# Altium schematic symbol library Regulator_Switching.SchLib: 1120 symbols (part 3 of 8) (continued)
## LNK615PG (continued)

## LNK616DG
designator *  value LNK616DG  Reference: U
ki_keywords: Energy-Efficient, Accurate CV/CC Switcher for Adapters and Chargers; ki_description: LinkSwitch-II Family, 6.1W Output Power, SO-8C; ki_fp_filters: PowerIntegrations?SO?8C*; Footprint: Package_SO:PowerIntegrations_SO-8C; Datasheet: http://www.powerint.com/sites/default/files/product-docs/linkswitch-ii_family_datasheet.pdf
pins: 1 FB, 2 BP/M, 4 D, 5 S, 6 S hidden, 7 S hidden, 8 S hidden

## LNK616GG
designator *  value LNK616GG  Reference: U
ki_keywords: Energy-Efficient, Accurate CV/CC Switcher for Adapters and Chargers; ki_description: LinkSwitch-II Family, 6.1W Output Power, SMD-8C; ki_fp_filters: PowerIntegrations?SMD?8C*; Footprint: Package_DIP:PowerIntegrations_SMD-8C; Datasheet: http://www.powerint.com/sites/default/files/product-docs/linkswitch-ii_family_datasheet.pdf
pins: 1 FB, 2 BP/M, 4 D, 5 S, 6 S hidden, 7 S hidden, 8 S hidden

## LNK616PG
designator *  value LNK616PG  Reference: U
ki_keywords: Energy-Efficient, Accurate CV/CC Switcher for Adapters and Chargers; ki_description: LinkSwitch-II Family, 6.1W Output Power, DIP-8C; ki_fp_filters: PowerIntegrations?PDIP?8C*; Footprint: Package_DIP:PowerIntegrations_PDIP-8C; Datasheet: http://www.powerint.com/sites/default/files/product-docs/linkswitch-ii_family_datasheet.pdf
pins: 1 FB, 2 BP/M, 4 D, 5 S, 6 S hidden, 7 S hidden, 8 S hidden

## LNK623DG
designator *  value LNK623DG  Reference: U
ki_keywords: Energy-Efficient, Off-line Switcher with Accurate Primary-side Constant-Voltage Control; ki_description: LinkSwitch-CV Family, 6W Output Power, SO-8C; ki_fp_filters: PowerIntegrations?SO?8C*; Footprint: Package_SO:PowerIntegrations_SO-8C; Datasheet: http://www.powerint.com/sites/default/files/product-docs/linkcv_family_datasheet.pdf
pins: 1 FB, 2 BP, 4 D, 5 S, 6 S hidden, 7 S hidden, 8 S hidden

## LNK623PG
designator *  value LNK623PG  Reference: U
ki_keywords: Energy-Efficient, Off-line Switcher with Accurate Primary-side Constant-Voltage Control; ki_description: LinkSwitch-CV Family, 6W Output Power, DIP-8C; ki_fp_filters: PowerIntegrations?PDIP?8C*; Footprint: Package_DIP:PowerIntegrations_PDIP-8C; Datasheet: http://www.powerint.com/sites/default/files/product-docs/linkcv_family_datasheet.pdf
pins: 1 FB, 2 BP, 4 D, 5 S, 6 S hidden, 7 S hidden, 8 S hidden

## LNK624DG
designator *  value LNK624DG  Reference: U
ki_keywords: Energy-Effi cient, Off-line Switcher with Accurate Primary-side Constant-Voltage Control; ki_description: LinkSwitch-CV Family, 6.5W Output Power, SO-8C; ki_fp_filters: PowerIntegrations?SO?8C*; Footprint: Package_SO:PowerIntegrations_SO-8C; Datasheet: http://www.powerint.com/sites/default/files/product-docs/linkcv_family_datasheet.pdf
pins: 1 FB, 2 BP, 4 D, 5 S, 6 S hidden, 7 S hidden, 8 S hidden

## LNK624PG
designator *  value LNK624PG  Reference: U
ki_keywords: Energy-Efficient, Off-line Switcher with Accurate Primary-side Constant-Voltage Control; ki_description: LinkSwitch-CV Family, 6.5W Output Power, DIP-8C; ki_fp_filters: PowerIntegrations?PDIP?8C*; Footprint: Package_DIP:PowerIntegrations_PDIP-8C; Datasheet: http://www.powerint.com/sites/default/files/product-docs/linkcv_family_datasheet.pdf
pins: 1 FB, 2 BP, 4 D, 5 S, 6 S hidden, 7 S hidden, 8 S hidden

## LNK625DG
designator *  value LNK625DG  Reference: U
ki_keywords: Energy-Efficient, Off-line Switcher with Accurate Primary-side Constant-Voltage Control; ki_description: LinkSwitch-CV Family, 8W Output Power, SO-8C; ki_fp_filters: PowerIntegrations?SO?8C*; Footprint: Package_SO:PowerIntegrations_SO-8C; Datasheet: http://www.powerint.com/sites/default/files/product-docs/linkcv_family_datasheet.pdf
pins: 1 FB, 2 BP, 4 D, 5 S, 6 S hidden, 7 S hidden, 8 S hidden

## LNK625PG
designator *  value LNK625PG  Reference: U
ki_keywords: Energy-Efficient, Off-line Switcher with Accurate Primary-side Constant-Voltage Control; ki_description: LinkSwitch-CV Family, 8W Output Power, DIP-8C; ki_fp_filters: PowerIntegrations?PDIP?8C*; Footprint: Package_DIP:PowerIntegrations_PDIP-8C; Datasheet: http://www.powerint.com/sites/default/files/product-docs/linkcv_family_datasheet.pdf
pins: 1 FB, 2 BP, 4 D, 5 S, 6 S hidden, 7 S hidden, 8 S hidden

## LNK626DG
designator *  value LNK626DG  Reference: U
ki_keywords: Energy-Efficient, Off-line Switcher with Accurate Primary-side Constant-Voltage Control; ki_description: LinkSwitch-CV Family, 10W Output Power, SO-8C; ki_fp_filters: PowerIntegrations?SO?8C*; Footprint: Package_SO:PowerIntegrations_SO-8C; Datasheet: http://www.powerint.com/sites/default/files/product-docs/linkcv_family_datasheet.pdf
pins: 1 FB, 2 BP, 4 D, 5 S, 6 S hidden, 7 S hidden, 8 S hidden

## LNK626PG
designator *  value LNK626PG  Reference: U
ki_keywords: Energy-Efficient, Off-line Switcher with Accurate Primary-side Constant-Voltage Control; ki_description: LinkSwitch-CV Family, 10W Output Power, DIP-8C; ki_fp_filters: PowerIntegrations?PDIP?8C*; Footprint: Package_DIP:PowerIntegrations_PDIP-8C; Datasheet: http://www.powerint.com/sites/default/files/product-docs/linkcv_family_datasheet.pdf
pins: 1 FB, 2 BP, 4 D, 5 S, 6 S hidden, 7 S hidden, 8 S hidden

## LNK632DG
designator *  value LNK632DG  Reference: U
ki_keywords: Energy-Efficient, Accurate CV Switcher With CC Control for Adapters and Chargers; ki_description: LinkSwitch-II Family, 3.1W Output Power, SO-8C; ki_fp_filters: PowerIntegrations?SO?8C*; Footprint: Package_SO:PowerIntegrations_SO-8C; Datasheet: http://www.powerint.com/sites/default/files/product-docs/linkswitch-ii_632DG_datasheet.pdf
pins: 1 FB, 2 BP/M, 4 D, 5 S, 6 S hidden, 7 S hidden, 8 S hidden

## LNK3202D
designator *  value LNK3202D  Reference: U
ki_keywords: Lowest Component Count, Energy-Efficient Off-Line Switcher IC; ki_description: LinkSwitch-TN2 Family, 80mA Output Current, SO-8C; ki_fp_filters: PowerIntegrations?SO?8C*; Footprint: Package_SO:PowerIntegrations_SO-8C; Datasheet: https://ac-dc.power.com/sites/default/files/product-docs/LinkSwitch-TN2_family_datasheet.pdf
pins: 1 BP/M, 2 FB, 4 D, 5 S, 6 S hidden, 7 S hidden, 8 S hidden

## LNK3202G
designator *  value LNK3202G  Reference: U
ki_keywords: Lowest Component Count, Energy-Efficient Off-Line Switcher IC; ki_description: LinkSwitch-TN2 Family, 80mA Output Current, SMD-8C; ki_fp_filters: PowerIntegrations?SMD?8C*; Footprint: Package_DIP:PowerIntegrations_SMD-8C; Datasheet: https://ac-dc.power.com/sites/default/files/product-docs/LinkSwitch-TN2_family_datasheet.pdf
pins: 1 BP/M, 2 FB, 4 D, 5 S, 6 S hidden, 7 S hidden, 8 S hidden

## LNK3202P
designator *  value LNK3202P  Reference: U
ki_keywords: Lowest Component Count, Energy-Efficient Off-Line Switcher IC; ki_description: LinkSwitch-TN2 Family, 80mA Output Current, DIP-8C; ki_fp_filters: PowerIntegrations?PDIP?8C*; Footprint: Package_DIP:PowerIntegrations_PDIP-8C; Datasheet: https://ac-dc.power.com/sites/default/files/product-docs/LinkSwitch-TN2_family_datasheet.pdf
pins: 1 BP/M, 2 FB, 4 D, 5 S, 6 S hidden, 7 S hidden, 8 S hidden

## LNK3204D
designator *  value LNK3204D  Reference: U
ki_keywords: Lowest Component Count, Energy-Efficient Off-Line Switcher IC; ki_description: LinkSwitch-TN2 Family, 170mA Output Current, SO-8C; ki_fp_filters: PowerIntegrations?SO?8C*; Footprint: Package_SO:PowerIntegrations_SO-8C; Datasheet: https://ac-dc.power.com/sites/default/files/product-docs/LinkSwitch-TN2_family_datasheet.pdf
pins: 1 BP/M, 2 FB, 4 D, 5 S, 6 S hidden, 7 S hidden, 8 S hidden

## LNK3204G
designator *  value LNK3204G  Reference: U
ki_keywords: Lowest Component Count, Energy-Efficient Off-Line Switcher IC; ki_description: LinkSwitch-TN2 Family, 170mA Output Current, SMD-8C; ki_fp_filters: PowerIntegrations?SMD?8C*; Footprint: Package_DIP:PowerIntegrations_SMD-8C; Datasheet: https://ac-dc.power.com/sites/default/files/product-docs/LinkSwitch-TN2_family_datasheet.pdf
pins: 1 BP/M, 2 FB, 4 D, 5 S, 6 S hidden, 7 S hidden, 8 S hidden

## LNK3204P
designator *  value LNK3204P  Reference: U
ki_keywords: Lowest Component Count, Energy-Efficient Off-Line Switcher IC; ki_description: LinkSwitch-TN2 Family, 170mA Output Current, DIP-8C; ki_fp_filters: PowerIntegrations?PDIP?8C*; Footprint: Package_DIP:PowerIntegrations_PDIP-8C; Datasheet: https://ac-dc.power.com/sites/default/files/product-docs/LinkSwitch-TN2_family_datasheet.pdf
pins: 1 BP/M, 2 FB, 4 D, 5 S, 6 S hidden, 7 S hidden, 8 S hidden

## LNK3205D
designator *  value LNK3205D  Reference: U
ki_keywords: Lowest Component Count, Energy-Efficient Off-Line Switcher IC; ki_description: LinkSwitch-TN Family, 270mA Output Current, SO-8C; ki_fp_filters: PowerIntegrations?SO?8C*; Footprint: Package_SO:PowerIntegrations_SO-8C; Datasheet: https://ac-dc.power.com/sites/default/files/product-docs/LinkSwitch-TN2_family_datasheet.pdf
pins: 1 BP/M, 2 FB, 4 D, 5 S, 6 S hidden, 7 S hidden, 8 S hidden

## LNK3205G
designator *  value LNK3205G  Reference: U
ki_keywords: Lowest Component Count, Energy-Efficient Off-Line Switcher IC; ki_description: LinkSwitch-TN Family, 270mA Output Current, SMD-8C; ki_fp_filters: PowerIntegrations?SMD?8C*; Footprint: Package_DIP:PowerIntegrations_SMD-8C; Datasheet: https://ac-dc.power.com/sites/default/files/product-docs/LinkSwitch-TN2_family_datasheet.pdf
pins: 1 BP/M, 2 FB, 4 D, 5 S, 6 S hidden, 7 S hidden, 8 S hidden

## LNK3205P
designator *  value LNK3205P  Reference: U
ki_keywords: Lowest Component Count, Energy-Efficient Off-Line Switcher IC; ki_description: LinkSwitch-TN Family, 270mA Output Current, DIP-8C; ki_fp_filters: PowerIntegrations?PDIP?8C*; Footprint: Package_DIP:PowerIntegrations_PDIP-8C; Datasheet: https://ac-dc.power.com/sites/default/files/product-docs/LinkSwitch-TN2_family_datasheet.pdf
pins: 1 BP/M, 2 FB, 4 D, 5 S, 6 S hidden, 7 S hidden, 8 S hidden

## LNK3206D
designator *  value LNK3206D  Reference: U
ki_keywords: Lowest Component Count, Energy-Efficient Off-Line Switcher IC; ki_description: LinkSwitch-TN2 Family, 360mA Output Current, SO-8C; ki_fp_filters: PowerIntegrations?SO?8C*; Footprint: Package_SO:PowerIntegrations_SO-8C; Datasheet: https://ac-dc.power.com/sites/default/files/product-docs/LinkSwitch-TN2_family_datasheet.pdf
pins: 1 BP/M, 2 FB, 4 D, 5 S, 6 S hidden, 7 S hidden, 8 S hidden

## LNK3206G
designator *  value LNK3206G  Reference: U
ki_keywords: Lowest Component Count, Energy-Efficient Off-Line Switcher IC; ki_description: LinkSwitch-TN2 Family, 360mA Output Current, SMD-8C; ki_fp_filters: PowerIntegrations?SMD?8C*; Footprint: Package_DIP:PowerIntegrations_SMD-8C; Datasheet: https://ac-dc.power.com/sites/default/files/product-docs/LinkSwitch-TN2_family_datasheet.pdf
pins: 1 BP/M, 2 FB, 4 D, 5 S, 6 S hidden, 7 S hidden, 8 S hidden

## LNK3206P
designator *  value LNK3206P  Reference: U
ki_keywords: Lowest Component Count, Energy-Efficient Off-Line Switcher IC; ki_description: LinkSwitch-TN2 Family, 360mA Output Current, DIP-8B; ki_fp_filters: PowerIntegrations?PDIP?8C*; Footprint: Package_DIP:PowerIntegrations_PDIP-8C; Datasheet: https://ac-dc.power.com/sites/default/files/product-docs/LinkSwitch-TN2_family_datasheet.pdf
pins: 1 BP/M, 2 FB, 4 D, 5 S, 6 S hidden, 7 S hidden, 8 S hidden

## LT1073CN
designator *  value LT1073CN  Reference: U
ki_keywords: Micropower DC/DC Converter; ki_description: Micropower DC/DC Converter Adjustable Output Voltage, DIP-8; ki_fp_filters: DIP*W7.62mm*; Footprint: Package_DIP:DIP-8_W7.62mm; Datasheet: https://www.analog.com/media/en/technical-documentation/data-sheets/1073fa.pdf
pins: 1 Ilim, 2 Vin, 3 SW1, 4 SW2, 5 GND, 6 A0, 7 SET, 8 FB

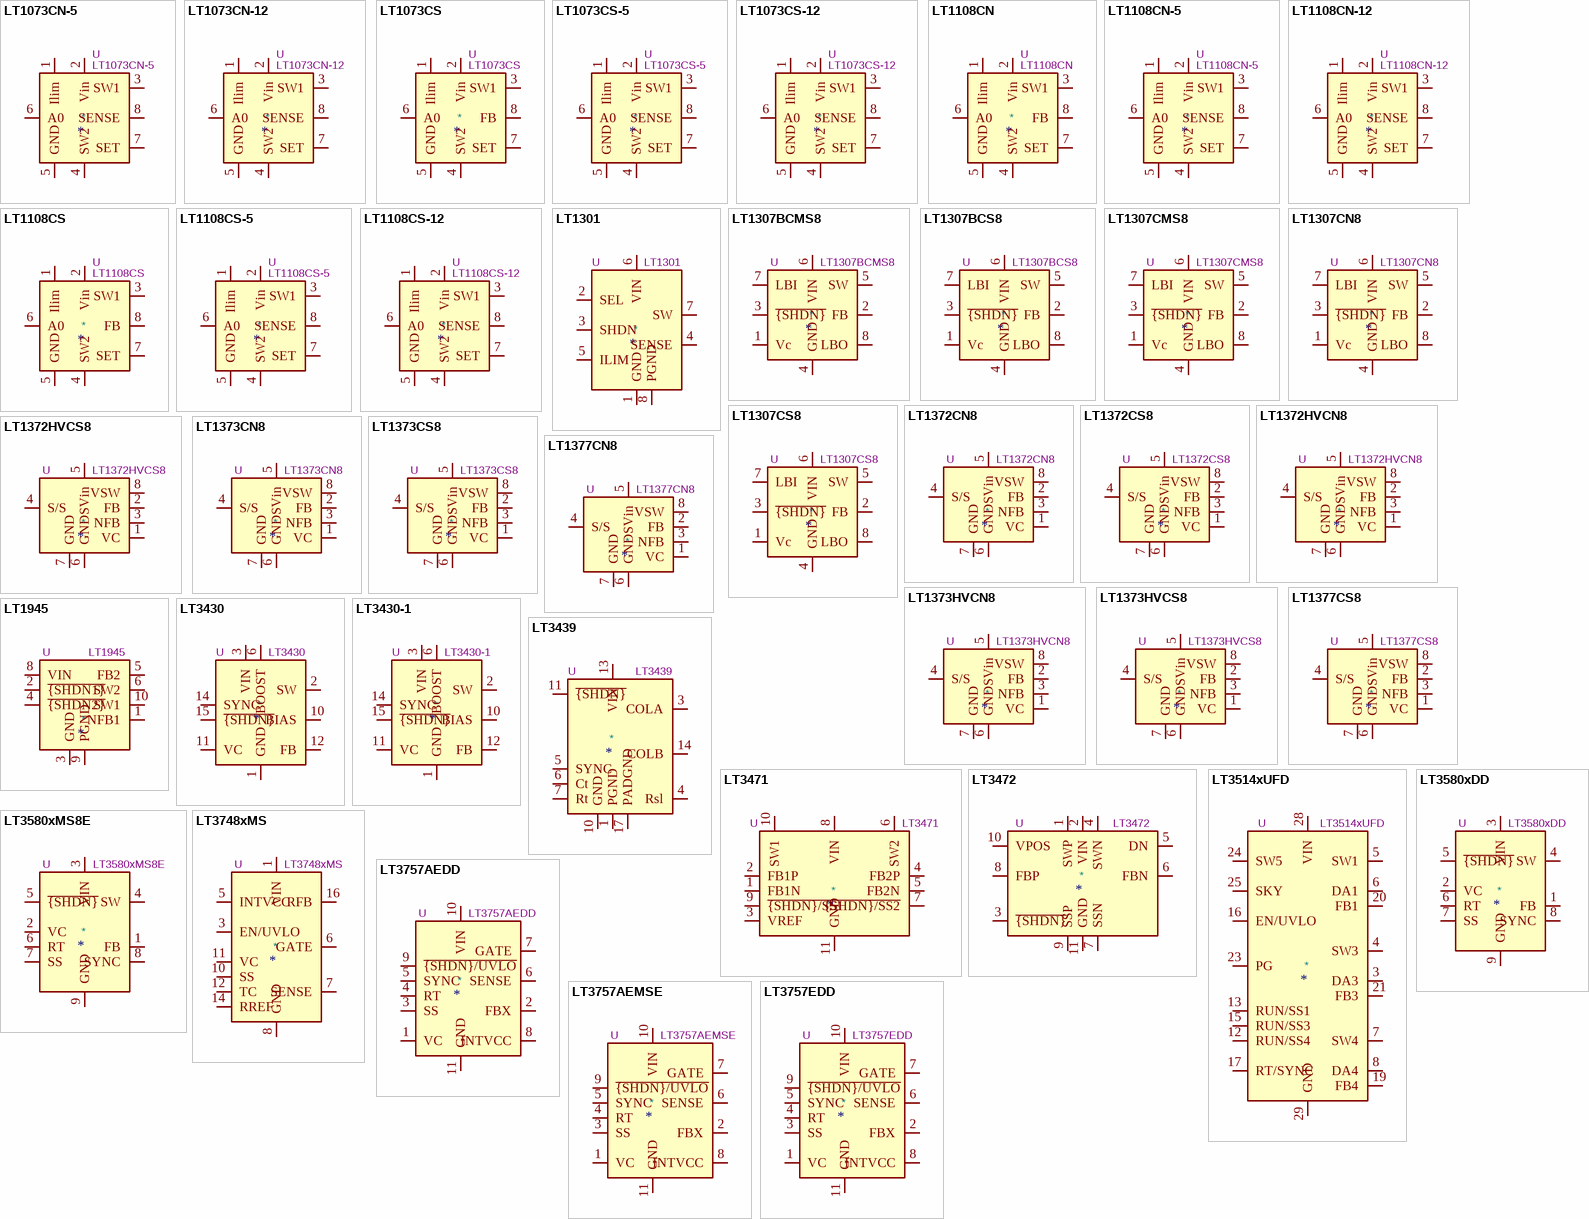
[diagram p11: symbols LT1073CN-5 to LT3757EDD]

## LT1073CN-5
designator *  value LT1073CN-5  Reference: U
ki_keywords: Micropower DC/DC Converter; ki_description: Micropower DC/DC Converter, Fixed 5V Output Voltage, DIP-8; ki_fp_filters: DIP*W7.62mm*; Footprint: Package_DIP:DIP-8_W7.62mm; Datasheet: https://www.analog.com/media/en/technical-documentation/data-sheets/1073fa.pdf
pins: 1 Ilim, 2 Vin, 3 SW1, 4 SW2, 5 GND, 6 A0, 7 SET, 8 SENSE

## LT1073CN-12
designator *  value LT1073CN-12  Reference: U
ki_keywords: Micropower DC/DC Converter; ki_description: Micropower DC/DC Converter, Fixed 12V Output Voltage, DIP-8; ki_fp_filters: DIP*W7.62mm*; Footprint: Package_DIP:DIP-8_W7.62mm; Datasheet: https://www.analog.com/media/en/technical-documentation/data-sheets/1073fa.pdf
pins: 1 Ilim, 2 Vin, 3 SW1, 4 SW2, 5 GND, 6 A0, 7 SET, 8 SENSE

## LT1073CS
designator *  value LT1073CS  Reference: U
ki_keywords: Micropower DC/DC Converter; ki_description: Micropower DC/DC Converter Adjustable Output Voltage, SO-8; ki_fp_filters: SOIC*3.9x4.9mm*; Footprint: Package_SO:SOIC-8_3.9x4.9mm_P1.27mm; Datasheet: https://www.analog.com/media/en/technical-documentation/data-sheets/1073fa.pdf
pins: 1 Ilim, 2 Vin, 3 SW1, 4 SW2, 5 GND, 6 A0, 7 SET, 8 FB

## LT1073CS-5
designator *  value LT1073CS-5  Reference: U
ki_keywords: Micropower DC/DC Converter; ki_description: Micropower DC/DC Converter, Fixed 5V Output Voltage, SO-8; ki_fp_filters: SOIC*3.9x4.9mm*P1.27mm*; Footprint: Package_SO:SOIC-8_3.9x4.9mm_P1.27mm; Datasheet: https://www.analog.com/media/en/technical-documentation/data-sheets/1073fa.pdf
pins: 1 Ilim, 2 Vin, 3 SW1, 4 SW2, 5 GND, 6 A0, 7 SET, 8 SENSE

## LT1073CS-12
designator *  value LT1073CS-12  Reference: U
ki_keywords: Micropower DC/DC Converter; ki_description: Micropower DC/DC Converter, Fixed 12V Output Voltage, SO-8; ki_fp_filters: SOIC*3.9x4.9mm*P1.27mm*; Footprint: Package_SO:SOIC-8_3.9x4.9mm_P1.27mm; Datasheet: https://www.analog.com/media/en/technical-documentation/data-sheets/1073fa.pdf
pins: 1 Ilim, 2 Vin, 3 SW1, 4 SW2, 5 GND, 6 A0, 7 SET, 8 SENSE

## LT1108CN
designator *  value LT1108CN  Reference: U
ki_keywords: switching buck boost converter step-down step-up; ki_description: Micropower DC-DC converter, step-up or step-down operation, 2V-30Vin, adjustable output voltage, DIP-8; ki_fp_filters: DIP*W7.62mm*; Footprint: Package_DIP:DIP-8_W7.62mm; Datasheet: https://www.analog.com/media/en/technical-documentation/data-sheets/lt1108.pdf
pins: 1 Ilim, 2 Vin, 3 SW1, 4 SW2, 5 GND, 6 A0, 7 SET, 8 FB

## LT1108CN-5
designator *  value LT1108CN-5  Reference: U
ki_keywords: switching buck boost converter step-down step-up; ki_description: Micropower DC-DC converter, step-up or step-down operation, 2V-30Vin, fixed 5V output voltage, DIP-8; ki_fp_filters: DIP*W7.62mm*; Footprint: Package_DIP:DIP-8_W7.62mm; Datasheet: https://www.analog.com/media/en/technical-documentation/data-sheets/lt1108.pdf
pins: 1 Ilim, 2 Vin, 3 SW1, 4 SW2, 5 GND, 6 A0, 7 SET, 8 SENSE

## LT1108CN-12
designator *  value LT1108CN-12  Reference: U
ki_keywords: switching buck boost converter step-down step-up; ki_description: Micropower DC-DC converter, step-up or step-down operation, 2V-30Vin, fixed 12V output voltage, DIP-8; ki_fp_filters: DIP*W7.62mm*; Footprint: Package_DIP:DIP-8_W7.62mm; Datasheet: https://www.analog.com/media/en/technical-documentation/data-sheets/lt1108.pdf
pins: 1 Ilim, 2 Vin, 3 SW1, 4 SW2, 5 GND, 6 A0, 7 SET, 8 SENSE

## LT1108CS
designator *  value LT1108CS  Reference: U
ki_keywords: switching buck boost converter step-down step-up; ki_description: Micropower DC-DC converter, step-up or step-down operation, 2V-30Vin, adjustable output voltage, SO-8; ki_fp_filters: SOIC*3.9x4.9mm*; Footprint: Package_SO:SOIC-8_3.9x4.9mm_P1.27mm; Datasheet: https://www.analog.com/media/en/technical-documentation/data-sheets/lt1108.pdf
pins: 1 Ilim, 2 Vin, 3 SW1, 4 SW2, 5 GND, 6 A0, 7 SET, 8 FB

## LT1108CS-5
designator *  value LT1108CS-5  Reference: U
ki_keywords: switching buck boost converter step-down step-up; ki_description: Micropower DC-DC converter, step-up or step-down operation, 2V-30Vin, fixed 5V output voltage, SO-8; ki_fp_filters: SOIC*3.9x4.9mm*P1.27mm*; Footprint: Package_SO:SOIC-8_3.9x4.9mm_P1.27mm; Datasheet: https://www.analog.com/media/en/technical-documentation/data-sheets/lt1108.pdf
pins: 1 Ilim, 2 Vin, 3 SW1, 4 SW2, 5 GND, 6 A0, 7 SET, 8 SENSE

## LT1108CS-12
designator *  value LT1108CS-12  Reference: U
ki_keywords: switching buck boost converter step-down step-up; ki_description: Micropower DC-DC converter, step-up or step-down operation, 2V-30Vin, fixed 12V output voltage, SO-8; ki_fp_filters: SOIC*3.9x4.9mm*P1.27mm*; Footprint: Package_SO:SOIC-8_3.9x4.9mm_P1.27mm; Datasheet: https://www.analog.com/media/en/technical-documentation/data-sheets/lt1108.pdf
pins: 1 Ilim, 2 Vin, 3 SW1, 4 SW2, 5 GND, 6 A0, 7 SET, 8 SENSE

## LT1301
designator *  value LT1301  Reference: U
ki_keywords: 5v 12v dc converter boost; ki_description: Micropower High Efficiency 5V/12V Step-Up DC/DC Converter for Flash Memory, DIP-8/SOIC-8; ki_fp_filters: DIP*7.62mm* SOIC*3.9x4.9mm*P1.27mm*; Datasheet: https://www.analog.com/media/en/technical-documentation/data-sheets/lt1301.pdf
pins: 1 GND, 2 SEL, 3 SHDN, 4 SENSE, 5 ILIM, 6 VIN, 7 SW, 8 PGND

## LT1307BCMS8
designator *  value LT1307BCMS8  Reference: U
ki_keywords: Micropower PWM DC/DC Converter; ki_description: Single Cell Micropower 600kHz PWM DC/DC Converter, 10µA Quiescent Current, MSOP-8; ki_fp_filters: MSOP*3x3mm*P0.5mm*; Footprint: Package_SO:MSOP-10_3x3mm_P0.5mm; Datasheet: https://www.analog.com/media/en/technical-documentation/data-sheets/1307fa.pdf
pins: 1 Vc, 2 FB, 3 ~{{SHDN}}, 4 GND, 5 SW, 6 VIN, 7 LBI, 8 LBO

## LT1307BCS8
designator *  value LT1307BCS8  Reference: U
ki_keywords: Micropower PWM DC/DC Converter; ki_description: Single Cell Micropower 600kHz PWM DC/DC Converter, 10µA Quiescent Current, SO-8; ki_fp_filters: SOIC*3.9x4.9mm*P1.27mm*; Footprint: Package_SO:SOIC-8_3.9x4.9mm_P1.27mm; Datasheet: https://www.analog.com/media/en/technical-documentation/data-sheets/1307fa.pdf
pins: 1 Vc, 2 FB, 3 ~{{SHDN}}, 4 GND, 5 SW, 6 VIN, 7 LBI, 8 LBO

## LT1307CMS8
designator *  value LT1307CMS8  Reference: U
ki_keywords: Micropower PWM DC/DC Converter; ki_description: Single Cell Micropower 600kHz PWM DC/DC Converter, 50µA Quiescent Current, MSOP-8; ki_fp_filters: MSOP*3x3mm*P0.5mm*; Footprint: Package_SO:MSOP-10_3x3mm_P0.5mm; Datasheet: https://www.analog.com/media/en/technical-documentation/data-sheets/1307fa.pdf
pins: 1 Vc, 2 FB, 3 ~{{SHDN}}, 4 GND, 5 SW, 6 VIN, 7 LBI, 8 LBO

## LT1307CN8
designator *  value LT1307CN8  Reference: U
ki_keywords: Micropower PWM DC/DC Converter; ki_description: Single Cell Micropower 600kHz PWM DC/DC Converter, 50µA Quiescent Current, DIP-8; ki_fp_filters: DIP*W7.62mm*; Footprint: Package_DIP:DIP-8_W7.62mm; Datasheet: https://www.analog.com/media/en/technical-documentation/data-sheets/1307fa.pdf
pins: 1 Vc, 2 FB, 3 ~{{SHDN}}, 4 GND, 5 SW, 6 VIN, 7 LBI, 8 LBO

## LT1307CS8
designator *  value LT1307CS8  Reference: U
ki_keywords: Micropower PWM DC/DC Converter; ki_description: Single Cell Micropower 600kHz PWM DC/DC Converter, 50µA Quiescent Current, SO-8; ki_fp_filters: SOIC*3.9x4.9mm*P1.27mm*; Footprint: Package_SO:SOIC-8_3.9x4.9mm_P1.27mm; Datasheet: https://www.analog.com/media/en/technical-documentation/data-sheets/1307fa.pdf
pins: 1 Vc, 2 FB, 3 ~{{SHDN}}, 4 GND, 5 SW, 6 VIN, 7 LBI, 8 LBO

## LT1372CN8
designator *  value LT1372CN8  Reference: U
ki_keywords: Switching Regulator Adjustable; ki_description: 1.5A High Efficiency Switching Regulators, 500kHz, 35V Switch Voltage, Adjustable Output Voltage, DIP-8; ki_fp_filters: DIP*W7.62mm*; Footprint: Package_DIP:DIP-8_W7.62mm; Datasheet: https://www.analog.com/media/en/technical-documentation/data-sheets/13727fbs.pdf
pins: 1 VC, 2 FB, 3 NFB, 4 S/S, 5 Vin, 6 GNDS, 7 GND, 8 VSW

## LT1372CS8
designator *  value LT1372CS8  Reference: U
ki_keywords: Switching Regulator Adjustable; ki_description: 1.5A High Efficiency Switching Regulators, 500kHz, 35V Switch Voltage, Adjustable Output Voltage, SO-8; ki_fp_filters: SOIC*3.9x4.9mm*P1.27mm*; Footprint: Package_SO:SOIC-8_3.9x4.9mm_P1.27mm; Datasheet: https://www.analog.com/media/en/technical-documentation/data-sheets/13727fbs.pdf
pins: 1 VC, 2 FB, 3 NFB, 4 S/S, 5 Vin, 6 GNDS, 7 GND, 8 VSW

## LT1372HVCN8
designator *  value LT1372HVCN8  Reference: U
ki_keywords: Switching Regulator Adjustable; ki_description: 1.5A High Efficiency Switching Regulators, 500kHz, 42V Switch Voltage, Adjustable Output Voltage, DIP-8; ki_fp_filters: DIP*W7.62mm*; Footprint: Package_DIP:DIP-8_W7.62mm; Datasheet: https://www.analog.com/media/en/technical-documentation/data-sheets/13727fbs.pdf
pins: 1 VC, 2 FB, 3 NFB, 4 S/S, 5 Vin, 6 GNDS, 7 GND, 8 VSW

## LT1372HVCS8
designator *  value LT1372HVCS8  Reference: U
ki_keywords: Switching Regulator Adjustable; ki_description: 1.5A High Efficiency Switching Regulators, 500kHz, 42V Switch Voltage, Adjustable Output Voltage, SO-8; ki_fp_filters: SOIC*3.9x4.9mm*P1.27mm*; Footprint: Package_SO:SOIC-8_3.9x4.9mm_P1.27mm; Datasheet: https://www.analog.com/media/en/technical-documentation/data-sheets/13727fbs.pdf
pins: 1 VC, 2 FB, 3 NFB, 4 S/S, 5 Vin, 6 GNDS, 7 GND, 8 VSW

## LT1373CN8
designator *  value LT1373CN8  Reference: U
ki_keywords: Switching Regulator Adjustable; ki_description: 1.5A Low Supply Current High Efficiency Switching Regulators, 250kHz, 35V Switch Voltage, Adjustable Output Voltage, DIP-8; ki_fp_filters: DIP*W7.62mm*; Footprint: Package_DIP:DIP-8_W7.62mm; Datasheet: https://www.analog.com/media/en/technical-documentation/data-sheets/1373fbs.pdf
pins: 1 VC, 2 FB, 3 NFB, 4 S/S, 5 Vin, 6 GNDS, 7 GND, 8 VSW

## LT1373CS8
designator *  value LT1373CS8  Reference: U
ki_keywords: Switching Regulator Adjustable; ki_description: 1.5A Low Supply Current High Efficiency Switching Regulators, 250kHz, 35V Switch Voltage, Adjustable Output Voltage, SO-8; ki_fp_filters: SOIC*3.9x4.9mm*P1.27mm*; Footprint: Package_SO:SOIC-8_3.9x4.9mm_P1.27mm; Datasheet: https://www.analog.com/media/en/technical-documentation/data-sheets/1373fbs.pdf
pins: 1 VC, 2 FB, 3 NFB, 4 S/S, 5 Vin, 6 GNDS, 7 GND, 8 VSW

## LT1373HVCN8
designator *  value LT1373HVCN8  Reference: U
ki_keywords: Switching Regulator Adjustable; ki_description: 1.5A Low Supply Current High Efficiency Switching Regulators, 250kHz, 42V Switch Voltage, Adjustable Output Voltage, DIP-8; ki_fp_filters: DIP*W7.62mm*; Footprint: Package_DIP:DIP-8_W7.62mm; Datasheet: https://www.analog.com/media/en/technical-documentation/data-sheets/1373fbs.pdf
pins: 1 VC, 2 FB, 3 NFB, 4 S/S, 5 Vin, 6 GNDS, 7 GND, 8 VSW

## LT1373HVCS8
designator *  value LT1373HVCS8  Reference: U
ki_keywords: Switching Regulator Adjustable; ki_description: 1.5A Low Supply Current High Efficiency Switching Regulators, 250kHz, 42V Switch Voltage, Adjustable Output Voltage, SO-8; ki_fp_filters: SOIC*3.9x4.9mm*P1.27mm*; Footprint: Package_SO:SOIC-8_3.9x4.9mm_P1.27mm; Datasheet: https://www.analog.com/media/en/technical-documentation/data-sheets/1373fbs.pdf
pins: 1 VC, 2 FB, 3 NFB, 4 S/S, 5 Vin, 6 GNDS, 7 GND, 8 VSW

## LT1377CN8
designator *  value LT1377CN8  Reference: U
ki_keywords: Switching Regulator Adjustable; ki_description: 1.5A High Efficiency Switching Regulators, 1MHz, 35V Switch Voltage, Adjustable Output Voltage, DIP-8; ki_fp_filters: DIP*W7.62mm*; Footprint: Package_DIP:DIP-8_W7.62mm; Datasheet: https://www.analog.com/media/en/technical-documentation/data-sheets/13727fbs.pdf
pins: 1 VC, 2 FB, 3 NFB, 4 S/S, 5 Vin, 6 GNDS, 7 GND, 8 VSW

## LT1377CS8
designator *  value LT1377CS8  Reference: U
ki_keywords: Switching Regulator Adjustable; ki_description: 1.5A High Efficiency Switching Regulators, 1MHz, 35V Switch Voltage, Adjustable Output Voltage, SO-8; ki_fp_filters: SOIC*3.9x4.9mm*P1.27mm*; Footprint: Package_SO:SOIC-8_3.9x4.9mm_P1.27mm; Datasheet: https://www.analog.com/media/en/technical-documentation/data-sheets/13727fbs.pdf
pins: 1 VC, 2 FB, 3 NFB, 4 S/S, 5 Vin, 6 GNDS, 7 GND, 8 VSW

## LT1945
designator *  value LT1945  Reference: U
ki_keywords: switched voltage converter regulator inverter double shutdown  positive negative; ki_description: Dual Micropower DC/DC Converter with Positive and Negative Outputs, MSOP-10; ki_fp_filters: MSOP*3x3mm*P0.5mm*; Footprint: Package_SO:MSOP-10_3x3mm_P0.5mm; Datasheet: https://www.analog.com/media/en/technical-documentation/data-sheets/1945fa.pdf
pins: 1 NFB1, 2 ~{{SHDN1}}, 3 GND, 4 ~{{SHDN2}}, 5 FB2, 6 SW2, 7 PGND hidden, 8 VIN, 9 PGND, 10 SW1

## LT3430
designator *  value LT3430  Reference: U
ki_keywords: Step-Down Switching Regulator; ki_description: 3A High Voltage 200kHz Step-Down Switching Regulator, TSSOP-16; ki_fp_filters: TSSOP*EP*4.4x5mm*P0.65mm*; Footprint: Package_SO:TSSOP-14-1EP_4.4x5mm_P0.65mm; Datasheet: https://www.analog.com/media/en/technical-documentation/data-sheets/34301fa.pdf
pins: 1 GND, 2 SW, 3 VIN, 4 VIN hidden, 5 SW hidden, 6 BOOST, 8 GND hidden, 9 GND hidden, 10 BIAS, 11 VC, 12 FB, 14 SYNC, 15 ~{{SHDN}}, 16 GND hidden, 17 GND hidden

## LT3430-1
designator *  value LT3430-1  Reference: U
ki_keywords: Step-Down Switching Regulator; ki_description: 3A High Voltage 100kHz Step-Down Switching Regulator, TSSOP-16; ki_fp_filters: TSSOP*EP*4.4x5mm*P0.65mm*; Footprint: Package_SO:TSSOP-14-1EP_4.4x5mm_P0.65mm; Datasheet: https://www.analog.com/media/en/technical-documentation/data-sheets/34301fa.pdf
pins: 1 GND, 2 SW, 3 VIN, 4 VIN hidden, 5 SW hidden, 6 BOOST, 8 GND hidden, 9 GND hidden, 10 BIAS, 11 VC, 12 FB, 14 SYNC, 15 ~{{SHDN}}, 16 GND hidden, 17 GND hidden

## LT3439
designator *  value LT3439  Reference: U
ki_keywords: Isolated DC/DC Transformer Driver; ki_description: 1A Slew Rate Controlled Ultralow Noise Isolated DC/DC Transformer Driver, TSSOP-16; ki_fp_filters: TSSOP*EP*4.4x5mm*P0.65mm*; Footprint: Package_SO:TSSOP-16-1EP_4.4x5mm_P0.65mm; Datasheet: https://www.analog.com/media/en/technical-documentation/data-sheets/3439fs.pdf
pins: 1 PGND, 2 NC hidden, 3 COLA, 4 Rsl, 5 SYNC, 6 Ct, 7 Rt, 8 NC hidden, 9 NC hidden, 10 GND, 11 ~{{SHDN}}, 12 NC hidden, 13 VIN, 14 COLB, 15 NC hidden, 16 PGND hidden, 17 PADGND

## LT3471
designator *  value LT3471  Reference: U
ki_keywords: dc/dc converter boost inverter; ki_description: Dual 1.3A, 1.2MHz Boost/Inverter, DFN-10; ki_fp_filters: DFN*1EP*3x3mm*P0.5mm*; Footprint: Package_DFN_QFN:DFN-10-1EP_3x3mm_P0.5mm_EP1.65x2.38mm; Datasheet: https://www.analog.com/media/en/technical-documentation/data-sheets/3471fb.pdf
pins: 1 FB1N, 2 FB1P, 3 VREF, 4 FB2P, 5 FB2N, 6 SW2, 7 ~{{SHDN}/SS2}, 8 VIN, 9 ~{{SHDN}/SS1}, 10 SW1, 11 GND

## LT3472
designator *  value LT3472  Reference: U
ki_keywords: DC/DC converter CCD Bias Boost; ki_description: Boost and Inverting DC/DC Converter for CCD Bias, DFN-10; ki_fp_filters: DFN*1EP*3x3mm*P0.5mm*; Footprint: Package_DFN_QFN:DFN-10-1EP_3x3mm_P0.5mm_EP1.65x2.38mm; Datasheet: https://www.analog.com/media/en/technical-documentation/data-sheets/3472f.pdf
pins: 1 SWP, 2 VIN, 3 ~{{SHDN}}, 4 SWN, 5 DN, 6 FBN, 7 SSN, 8 FBP, 9 SSP, 10 VPOS, 11 GND

## LT3514xUFD
designator *  value LT3514xUFD  Reference: U
ki_keywords: triple step-down; ki_description: Triple Step-Down Switching Regulator with 100% Duty Cycle Operation, QFN-28; ki_fp_filters: QFN*4x5mm*P0.5mm*; Footprint: Package_DFN_QFN:QFN-28-1EP_4x5mm_P0.5mm_EP2.65x3.65mm_ThermalVias; Datasheet: https://www.analog.com/media/en/technical-documentation/data-sheets/3514fa.pdf
pins: 1 NC hidden, 2 NC hidden, 3 DA3, 4 SW3, 5 SW1, 6 DA1, 7 SW4, 8 DA4, 9 VIN hidden, 10 GND hidden, 11 VIN hidden, 12 RUN/SS4, 13 RUN/SS1, 14 NC hidden, 15 RUN/SS3, 16 EN/UVLO, 17 RT/SYNC, 18 GND hidden, 19 FB4, 20 FB1, 21 FB3, 22 NC hidden, 23 PG, 24 SW5, 25 SKY, 26 VIN hidden, 27 GND hidden, 28 VIN, 29 GND

## LT3580xDD
designator *  value LT3580xDD  Reference: U
ki_keywords: boost inverting dc-dc; ki_description: Boost/Inverting DC/DC Converter with 2A Switch, Soft-Start, and Synchronization, DFN-8; ki_fp_filters: DFN*1EP*3x3mm*P0.5mm*; Footprint: Package_DFN_QFN:DFN-8-1EP_3x3mm_P0.5mm_EP1.66x2.38mm; Datasheet: https://www.analog.com/media/en/technical-documentation/data-sheets/3580fg.pdf
pins: 1 FB, 2 VC, 3 VIN, 4 SW, 5 ~{{SHDN}}, 6 RT, 7 SS, 8 SYNC, 9 GND

## LT3580xMS8E
designator *  value LT3580xMS8E  Reference: U
ki_keywords: boost inverting dc-dc; ki_description: Boost/Inverting DC/DC Converter with 2A Switch, Soft-Start, and Synchronization, MSOP-8; ki_fp_filters: MSOP*1EP*3x3mm*P0.65mm*; Footprint: Package_SO:MSOP-8-1EP_3x3mm_P0.65mm_EP1.68x1.88mm; Datasheet: https://www.analog.com/media/en/technical-documentation/data-sheets/3580fg.pdf
pins: 1 FB, 2 VC, 3 VIN, 4 SW, 5 ~{{SHDN}}, 6 RT, 7 SS, 8 SYNC, 9 GND

## LT3748xMS
designator *  value LT3748xMS  Reference: U
ki_keywords: isolated flyback controller; ki_description: 100V Isolated Flyback Controller, MSOP-16; ki_fp_filters: Linear*MSOP*3x4mm*P0.5mm*; Footprint: Package_SO:Linear_MSOP-12-16_3x4mm_P0.5mm; Datasheet: https://www.analog.com/media/en/technical-documentation/data-sheets/3748fb.pdf
pins: 1 VIN, 3 EN/UVLO, 5 INTVCC, 6 GATE, 7 SENSE, 8 GND, 9 GND hidden, 10 SS, 11 VC, 12 TC, 14 RREF, 16 RFB

## LT3757AEDD
designator *  value LT3757AEDD  Reference: U
ki_keywords: Boost flyback SEPIC inverting DC/DC regulator; ki_description: Boost, flyback, SEPIC and inverting regulator, improved load transient performance, DFN-10; ki_fp_filters: DFN*EP*3x3mm*P0.5mm*; Footprint: Package_DFN_QFN:DFN-10-1EP_3x3mm_P0.5mm_EP1.55x2.48mm; Datasheet: https://www.analog.com/media/en/technical-documentation/data-sheets/3757Afe.pdf
pins: 1 VC, 2 FBX, 3 SS, 4 RT, 5 SYNC, 6 SENSE, 7 GATE, 8 INTVCC, 9 ~{{SHDN}/UVLO}, 10 VIN, 11 GND

## LT3757AEMSE
designator *  value LT3757AEMSE  Reference: U
ki_keywords: Boost flyback SEPIC inverting DC/DC regulator; ki_description: Boost, flyback, SEPIC and inverting regulator, improved load transient performance, MSOP-10; ki_fp_filters: MSOP*EP*3x3mm*P0.5mm*; Footprint: Package_SO:MSOP-10-1EP_3x3mm_P0.5mm_EP1.68x1.88mm; Datasheet: https://www.analog.com/media/en/technical-documentation/data-sheets/3757Afe.pdf
pins: 1 VC, 2 FBX, 3 SS, 4 RT, 5 SYNC, 6 SENSE, 7 GATE, 8 INTVCC, 9 ~{{SHDN}/UVLO}, 10 VIN, 11 GND

## LT3757EDD
designator *  value LT3757EDD  Reference: U
ki_keywords: Boost flyback SEPIC inverting DC/DC regulator; ki_description: Boost, flyback, SEPIC and inverting regulator. DFN-10; ki_fp_filters: DFN*EP*3x3mm*P0.5mm*; Footprint: Package_DFN_QFN:DFN-10-1EP_3x3mm_P0.5mm_EP1.55x2.48mm; Datasheet: https://www.analog.com/media/en/technical-documentation/data-sheets/3757Afe.pdf
pins: 1 VC, 2 FBX, 3 SS, 4 RT, 5 SYNC, 6 SENSE, 7 GATE, 8 INTVCC, 9 ~{{SHDN}/UVLO}, 10 VIN, 11 GND

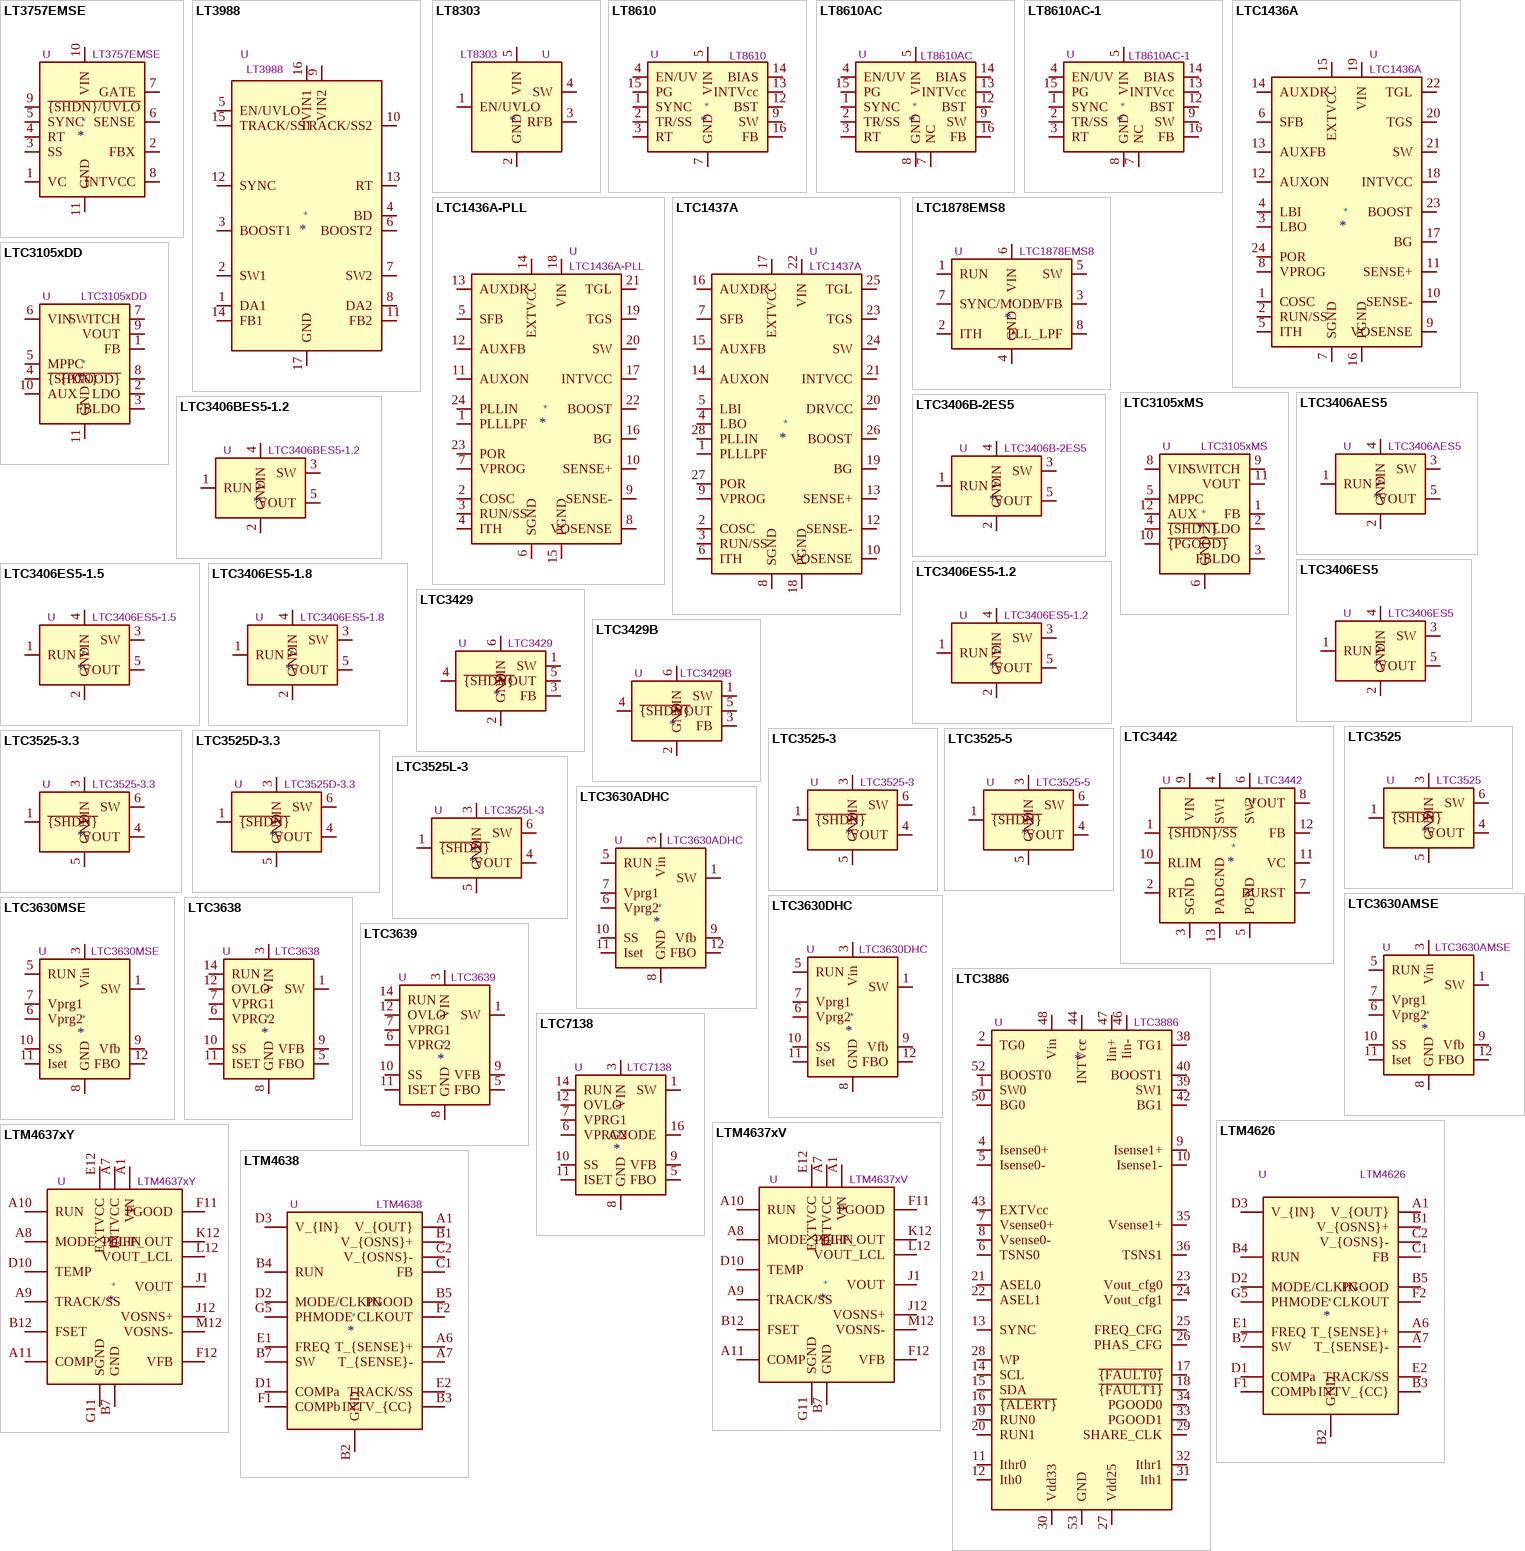
[diagram p12: symbols LT3757EMSE to LTM4638]

## LT3757EMSE
designator *  value LT3757EMSE  Reference: U
ki_keywords: Boost flyback SEPIC inverting DC/DC regulator; ki_description: Boost, flyback, SEPIC and inverting regulator. MSOP-10; ki_fp_filters: MSOP*EP*3x3mm*P0.5mm*; Footprint: Package_SO:MSOP-10-1EP_3x3mm_P0.5mm_EP1.68x1.88mm; Datasheet: https://www.analog.com/media/en/technical-documentation/data-sheets/3757Afe.pdf
pins: 1 VC, 2 FBX, 3 SS, 4 RT, 5 SYNC, 6 SENSE, 7 GATE, 8 INTVCC, 9 ~{{SHDN}/UVLO}, 10 VIN, 11 GND

## LT3988
designator *  value LT3988  Reference: U
ki_keywords: Dual 60V 1A Step-Down Switching Regulator; ki_description: Dual 1A Switching Buck Regulator with Internal Switches; ki_fp_filters: MSOP*16*1EP*3x4mm*P0.5mm*EP1.65x2.85mm*; Footprint: Package_SO:MSOP-16-1EP_3x4mm_P0.5mm_EP1.65x2.85mm; Datasheet: https://www.analog.com/media/en/technical-documentation/data-sheets/3988f.pdf
pins: 1 DA1, 2 SW1, 3 BOOST1, 4 BD, 5 EN/UVLO, 6 BOOST2, 7 SW2, 8 DA2, 9 VIN2, 10 TRACK/SS2, 11 FB2, 12 SYNC, 13 RT, 14 FB1, 15 TRACK/SS1, 16 VIN1, 17 GND

## LT8303
designator *  value LT8303  Reference: U
ki_keywords: Flyback switcher; ki_description: 100VIN Micropower Isolated Flyback Converter with 150V/450mA Switch, TSOT-23-5; ki_fp_filters: TSOT?23*; Footprint: Package_TO_SOT_SMD:TSOT-23-5; Datasheet: https://www.analog.com/media/en/technical-documentation/data-sheets/8303fa.pdf
pins: 1 EN/UVLO, 2 GND, 3 RFB, 4 SW, 5 VIN

## LT8610
designator *  value LT8610  Reference: U
ki_keywords: high efficiency speed synchronous monolithic buck step-down switching regulator 42V 2.5A; ki_description: 42V, 2.5A Synchronous Step-Down Regulator with 2.5uA Quiescent Current, MSOP-16; ki_fp_filters: MSOP*16*1EP*3x4.039mm*P0.5mm*; Footprint: Package_SO:MSOP-16-1EP_3x4.039mm_P0.5mm_EP1.651x2.845mm_ThermalVias; Datasheet: https://www.analog.com/media/en/technical-documentation/data-sheets/lt8610.pdf
pins: 1 SYNC, 2 TR/SS, 3 RT, 4 EN/UV, 5 VIN, 6 VIN hidden, 7 GND, 8 GND hidden, 9 SW, 10 SW hidden, 11 SW hidden, 12 BST, 13 INTVcc, 14 BIAS, 15 PG, 16 FB, 17 GND hidden

## LT8610AC
designator *  value LT8610AC  Reference: U
ki_keywords: high efficiency speed synchronous monolithic buck step-down switching regulator 42V 3.5A lower feedback voltage minimum vin; ki_description: 42V, 3.5A Synchronous Step-Down Regulator with 2.5uA Quiescent Current, 0.8V Feedback Voltage, 3.0V Minimum Vin, MSOP-16; ki_fp_filters: MSOP*16*1EP*3x4.039mm*P0.5mm*; Footprint: Package_SO:MSOP-16-1EP_3x4.039mm_P0.5mm_EP1.651x2.845mm_ThermalVias; Datasheet: https://www.analog.com/media/en/technical-documentation/data-sheets/lt8610ac-8610ac-1.pdf
pins: 1 SYNC, 2 TR/SS, 3 RT, 4 EN/UV, 5 VIN, 6 VIN hidden, 7 NC, 8 GND, 9 SW, 10 SW hidden, 11 SW hidden, 12 BST, 13 INTVcc, 14 BIAS, 15 PG, 16 FB, 17 GND hidden

## LT8610AC-1
designator *  value LT8610AC-1  Reference: U
ki_keywords: high efficiency speed synchronous monolithic buck step-down switching regulator 42V 3.5A lower feedback voltage minimum vin internal compensation soft-start; ki_description: 42V, 3.5A Synchronous Step-Down Regulator with 2.5uA Quiescent Current, Internal Compensation for Improved Transient, Soft-Start at Dropout and Brownout, MSOP-16; ki_fp_filters: LTC*MSOP*16*1EP*3x4mm*P0.5mm*EP2.15x3.26mm*; Footprint: Package_SO:LTC_MSOP-16-1EP_3x4mm_P0.5mm_EP2.15x3.26mm; Datasheet: https://www.analog.com/media/en/technical-documentation/data-sheets/8610acfa.pdf
pins: 1 SYNC, 2 TR/SS, 3 RT, 4 EN/UV, 5 VIN, 6 VIN hidden, 7 NC, 8 GND, 9 SW, 10 SW hidden, 11 SW hidden, 12 BST, 13 INTVcc, 14 BIAS, 15 PG, 16 FB, 17 GND hidden

## LTC1436A
designator *  value LTC1436A  Reference: U
ki_keywords: buck controller 36V; ki_description: High Efficiency Low Noise Synchronous Step-Down Switching Regulators, SSOP-24; ki_fp_filters: SSOP*3.9x8.7mm*P0.635mm*; Footprint: Package_SO:SSOP-24_3.9x8.7mm_P0.635mm; Datasheet: https://www.analog.com/media/en/technical-documentation/data-sheets/14367afb.pdf
pins: 1 COSC, 2 RUN/SS, 3 LBO, 4 LBI, 5 ITH, 6 SFB, 7 SGND, 8 VPROG, 9 VOSENSE, 10 SENSE-, 11 SENSE+, 12 AUXON, 13 AUXFB, 14 AUXDR, 15 EXTVCC, 16 PGND, 17 BG, 18 INTVCC, 19 VIN, 20 TGS, 21 SW, 22 TGL, 23 BOOST, 24 POR

## LTC1436A-PLL
designator *  value LTC1436A-PLL  Reference: U
ki_keywords: buck controller 36V; ki_description: High Efficiency Low Noise Synchronous Step-Down Switching Regulators, SSOP-24; ki_fp_filters: SSOP*3.9x8.7mm*P0.635mm*; Footprint: Package_SO:SSOP-24_3.9x8.7mm_P0.635mm; Datasheet: https://www.analog.com/media/en/technical-documentation/data-sheets/14367afb.pdf
pins: 1 PLLLPF, 2 COSC, 3 RUN/SS, 4 ITH, 5 SFB, 6 SGND, 7 VPROG, 8 VOSENSE, 9 SENSE-, 10 SENSE+, 11 AUXON, 12 AUXFB, 13 AUXDR, 14 EXTVCC, 15 PGND, 16 BG, 17 INTVCC, 18 VIN, 19 TGS, 20 SW, 21 TGL, 22 BOOST, 23 POR, 24 PLLIN

## LTC1437A
designator *  value LTC1437A  Reference: U
ki_keywords: buck controller 36V; ki_description: High Efficiency Low Noise Synchronous Step-Down Switching Regulators, SSOP-28; ki_fp_filters: SSOP*5.3x10.2mm*P0.65mm*; Footprint: Package_SO:SSOP-28_5.3x10.2mm_P0.65mm; Datasheet: https://www.analog.com/media/en/technical-documentation/data-sheets/14367afb.pdf
pins: 1 PLLLPF, 2 COSC, 3 RUN/SS, 4 LBO, 5 LBI, 6 ITH, 7 SFB, 8 SGND, 9 VPROG, 10 VOSENSE, 11 NC hidden, 12 SENSE-, 13 SENSE+, 14 AUXON, 15 AUXFB, 16 AUXDR, 17 EXTVCC, 18 PGND, 19 BG, 20 DRVCC, 21 INTVCC, 22 VIN, 23 TGS, 24 SW, 25 TGL, 26 BOOST, 27 POR, 28 PLLIN